# Altium footprint library Pcb.PcbLib: 33 footprints (part 3 of 3)
Each footprint in its own frame and in the unit in brackets; x right, y up, seen from the top. Pads: shape width x height; smd on the part's side, far side on the other; paste and mask are expansions set on the pad; w line width, h text height; cw(c..) or ccw(c..) is an arc to the next point about the centre after c.
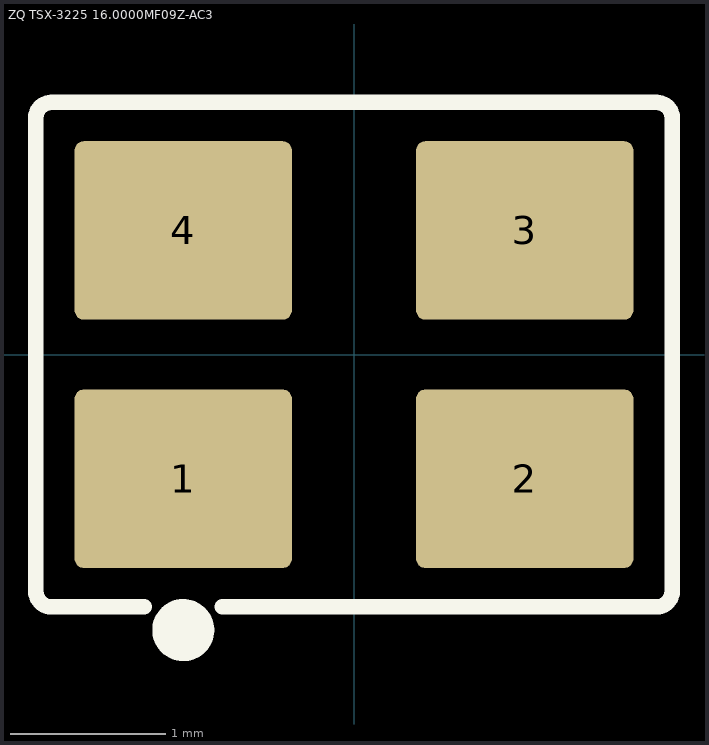
[diagram p2: the footprint, top view; thin cyan lines are the x and y axes]

## ZQ TSX-3225 16.0000MF09Z-AC3 [mm]
height 0.6
pads (4):
  rrect10% 1.4x1.15 smd: 1(-1.1,-0.8) 2(1.1,-0.8) 3(1.1,0.8) 4(-1.1,0.8)
Top Overlay:
  circle w0.2: c-1.1,-1.775 r0.1
  lines w0.1: -1.35,-1.625 -1.95,-1.625 cw(c-1.95,-1.525) -2.05,-1.525 -2.05,1.525 cw(c-1.95,1.525) -1.95,1.625 1.95,1.625 cw(c1.95,1.525) 2.05,1.525 2.05,-1.525 cw(c1.95,-1.525) 1.95,-1.625 -0.85,-1.625
3D body "TSX-3225 16M.SLDPRT": height 0.71, standoff 0, extent -1.6,-1.25 1.6,1.25